# Altium footprint library Airscout_PCB_LibV2.0.PcbLib: 52 footprints (part 4 of 4)
Each footprint in its own frame and in the unit in brackets; x right, y up, seen from the top. Pads: shape width x height; smd on the part's side, far side on the other; paste and mask are expansions set on the pad; w line width, h text height; cw(c..) or ccw(c..) is an arc to the next point about the centre after c.
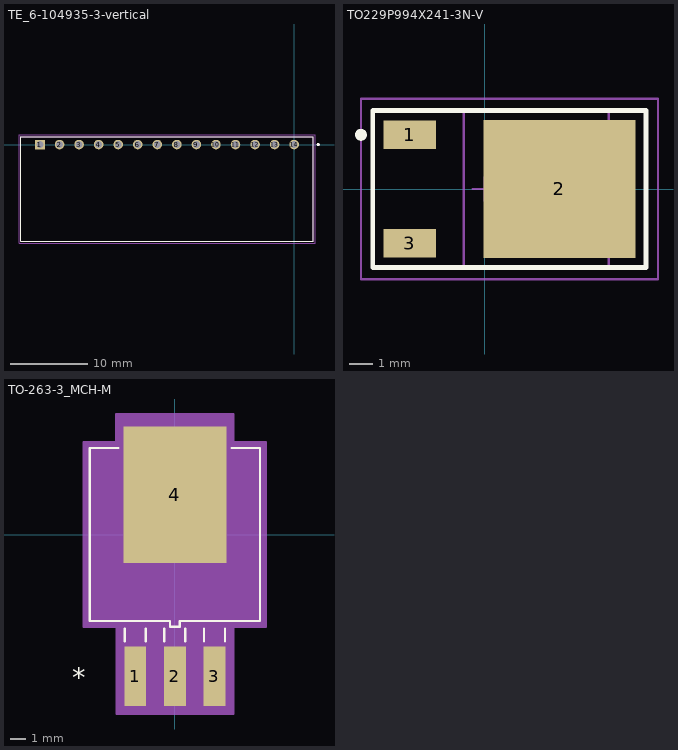
[diagram p3: the footprints below, top view; thin cyan lines are the x and y axes]

## TE_6-104935-3-vertical [mm]
pads (14):
  rect 1.24x1.24 hole 0.89: 1(-33.02,0)
  round 1.24 hole 0.89: 2(-30.48,0) 3(-27.94,0) 4(-25.4,0) 5(-22.86,0) 6(-20.32,0) 7(-17.78,0) 8(-15.24,0) 9(-12.7,0) 10(-10.16,0) 11(-7.62,0) 12(-5.08,0) 13(-2.54,0) 14(0,0)
Top Overlay:
  circle w0.2: c3.125,0 r0.1
  lines w0.127: -35.495,-12.57 2.475,-12.57 2.475,1.02 -35.495,1.02 -35.495,-12.57
Mechanical 13:
  circle w0.2: c3.125,0 r0.1
  lines w0.127: -35.495,-12.57 2.475,-12.57 ; -35.495,-12.57 2.475,-12.57 ; -35.495,-12.57 -35.495,1.02 2.475,1.02 2.475,-12.57
Mechanical 15:
  lines w0.05: -35.745,-12.82 2.725,-12.82 2.725,1.27 -35.745,1.27 -35.745,-12.82
3D body "705530013--3DModel-STEP-510211.STEP": height 6.98, standoff -3.3, extent -35.56,-12.763 2.54,0.826

## TO229P994X241-3N-V [mm] "TO,2.29mm pitch;2 pin,9.94mm L X 6.095mm W X 2.41mm H body"
height 2.41
pads (3):
  rect 2.2x1.2 smd paste+0 mask+0: 1(-3.15,2.28) 3(-3.15,-2.28)
  rect 6.4x5.8 smd paste+0 mask+0: 2(3.15,0)
Top Overlay:
  circle w0.25: c-5.2,2.28 r0.125
  lines w0.2: -4.7,-3.3 -4.7,3.3 6.8,3.3 6.8,-3.3 -4.7,-3.3
Mechanical 3:
  text ".DESIGNATOR" at 0,0 h1.2
Mechanical 13:
  lines w0.1: -0.875,-3.282 -0.875,3.282 5.22,3.282 5.22,-3.282 -0.875,-3.282
Mechanical 15:
  lines w0.1: -0.5,0 0.5,0 ; 0,-0.5 0,0.5 ; -5.2,-3.8 7.3,-3.8 7.3,3.8 -5.2,3.8 -5.2,-3.8
3D body "PG-TO252-3-311.stp": height 2.36, standoff 0, extent -3.94,-3.25 6.04,3.25

## TO-263-3_MCH-M [mil]
pads (4):
  rect 55x150 smd paste+0 mask+0: 1(-100,-358.5) 2(0,-358.5) 3(100,-358.5)
  rect 260x345 smd paste+0 mask+0: 4(0,101)
Top Overlay:
  lines w6: -143.1,218.5 -215,218.5 -215,-218.5 -12.5,-218.5 -12.5,-233.5 12.5,-233.5 12.5,-218.5 215,-218.5 215,218.5 143.1,218.5 ; -126.5,-269.5 -126.5,-237.5 ; -73.5,-269.5 -73.5,-237.5 ; -26.5,-269.5 -26.5,-237.5 ; 26.5,-269.5 26.5,-237.5 ; 73.5,-269.5 73.5,-237.5 ; 126.5,-269.5 126.5,-237.5
  text "*" at -259.84,-385.83 h50
Mechanical 13:
  lines w1: -210,-213.5 210,-213.5 210,213.5 -210,213.5 -210,-213.5 ; -126.5,-411.5 -126.5,-213.5 -73.5,-213.5 -73.5,-411.5 -126.5,-411.5 ; -26.5,-411.5 -26.5,-213.5 26.5,-213.5 26.5,-411.5 -26.5,-411.5 ; -7.5,-228.5 -7.5,-213.5 7.5,-213.5 7.5,-228.5 -7.5,-228.5 ; 73.5,-411.5 73.5,-213.5 126.5,-213.5 126.5,-411.5 73.5,-411.5
  text "*" at -259.84,-385.83 h50
Mechanical 15:
  region: -230,-233.5 -230,233.5 -148,233.5 -148,304.5 148,304.5 148,233.5 230,233.5 230,-233.5 147.5,-233.5 147.5,-453.5 -147.5,-453.5 -147.5,-233.5
  lines w6: -230,-233.5 -230,233.5 -148,233.5 -148,304.5 148,304.5 148,233.5 230,233.5 230,-233.5 147.5,-233.5 147.5,-453.5 -147.5,-453.5 -147.5,-233.5 -230,-233.5
3D body "TO-263-3_MCH.step": height 181.1, standoff -2.01, extent -210,-411.5 210,253.5

## TP4056 USB_C Charging Module [mm]